# Altium integrated library OpenCore_Carrier_Board.IntLib: 44 symbols (continued)
## KRIA_K26_SOM (continued)
part B pins: S1_C1 GND (power) "Ground, connect to carrier card ground plane", S1_C2 GND (power) "Ground, connect to carrier card ground plane", S1_C3 HPA00_CC_P (io) "HPIO clock-capable pin on bank 66", S1_C4 HPA00_CC_N (io) "HPIO clock-capable pin on bank 66", S1_C5 GND (power) "Ground, connect to carrier card ground plane", S1_C6 HPA03_P (io) "HPIO on bank 66", S1_C7 HPA03_N (io) "HPIO on bank 66", S1_C8 GND (power) "Ground, connect to carrier card ground plane", S1_C9 HPA08_P (io) "HPIO on bank 66", S1_C10 HPA08_N (io) "HPIO on bank 66", S1_C11 GND (power) "Ground, connect to carrier card ground plane", S1_C12 HPA10_CC_P (io) "HPIO clock-capable pin on bank 66", S1_C13 HPA10_CC_N (io) "HPIO clock-capable pin on bank 66", S1_C14 GND (power) "Ground, connect to carrier card ground plane", S1_C15 PS_POR_L (in) "PS power-on reset driven by the carrier card. When deasserted, the PS begins the boot process.", S1_C16 PS_SRST_C2M_L (in) "PS system reset driven by the carrier card. When asserted, forces the PS to enter the system reset sequence.", S1_C17 GND (power) "Ground, connect to carrier card ground plane", S1_C18 HDA06 (io) "HDIO on bank 45", S1_C19 HDA07 (io) "HDIO on bank 45", S1_C20 HDA08_CC (io) "HDIO clock-capable pin on bank 45", S1_C21 GND (power) "Ground", S1_C22 HDA18 (io) "HDIO on bank 45", S1_C23 HDA19 (io) "HDIO on bank 45", S1_C24 HDA20 (io) "HDIO on bank 45", S1_C25 GND (power) "Ground, connect to carrier card ground plane", S1_C26 MIO24_I2C_SCK (out) "PS I2C clock output, bank 500", S1_C27 MIO25_I2C_SDA (io) "PS I2C serial data, bank 500", S1_C28 MIO12_FWUEN_C2M_L (io) "PS MIO signal on bank 500. Optional default use as firmware update enable indication in the released Kria PetaLinux BSPs.", S1_C29 GND (power) "Ground, connect to carrier card ground plane", S1_C30 MIO29 (io) "PS MIO signal on bank 501. Optional use as PMU input.", S1_C31 MIO30 (io) "PS MIO signal on bank 501. Optional use as PMU input.", S1_C32 MIO31_PMU_GPI (io) "PS MIO signal on bank 501. Optional use as PMU input. In default Kria PetaLinux BSPs, this is a PMU library enabled input for hardware-initiated shutdown by the PMU.", S1_C33 GND (power) "Ground, connect to carrier card ground plane", S1_C34 MIO47 (io) "PS MIO signal on bank 501", S1_C35 MIO48 (io) "PS MIO signal on bank 501", S1_C36 MIO49 (io) "PS MIO signal on bank 501", S1_C37 GND (power) "Ground, connect to carrier card ground plane", S1_C38 MIO55 (io) "PS MIO signal on bank 502", S1_C39 MIO56 (io) "PS MIO signal on bank 502", S1_C40 MIO57 (io) "PS MIO signal on bank 502", S1_C41 GND (power) "Ground, connect to carrier card ground plane", S1_C42 MIO67 (io) "PS MIO signal on bank 502", S1_C43 MIO68 (io) "PS MIO signal on bank 502", S1_C44 MIO69 (io) "PS MIO signal on bank 502", S1_C45 Reserved "No connect on the SOM", S1_C46 GND (power) "Ground, connect to carrier card ground plane", S1_C47 GTR_REFCLK0_C2M_P (in) "PS-GTR REFCLK0 input, bank 505", S1_C48 GTR_REFCLK0_C2M_N (in) "PS-GTR REFCLK0 input, bank 505", S1_C49 GND (power) "Ground, connect to carrier card ground plane", S1_C50 GND (power) "Ground, connect to carrier card ground plane", S1_C51 GTR_DP3_M2C_P (out) "PS-GTR lane 3 TX, bank 505", S1_C52 GTR_DP3_M2C_N (out) "PS-GTR lane 3 TX, bank 505", S1_C53 GND (power) "Ground, connect to carrier card ground plane", S1_C54 GND (power) "Ground, connect to carrier card ground plane", S1_C55 GTR_DP1_C2M_P (in) "PS-GTR lane 1 RX, bank 505", S1_C56 GTR_DP1_C2M_N (in) "PS-GTR lane 1 RX, bank 505", S1_C57 GND (power) "Ground, connect to carrier card ground plane", S1_C58 GND (power) "Ground, connect to carrier card ground plane", S1_C59 VCC_SOM (power) "SOM main supply voltage, +5V", S1_C60 VCC_SOM (power) "SOM main supply voltage, +5V", S1_D1 VCCO_HPA (power) "HPA I/O voltage rail, 1.0V to 1.8V", S1_D2 VCCO_HPA (power) "HPA I/O voltage rail, 1.0V to 1.8V", S1_D3 GND (power) "Ground, connect to carrier card ground plane", S1_D4 HPA02_P (io) "HPIO on bank 66", S1_D5 HPA02_N (io) "HPIO on bank 66", S1_D6 GND (power) "Ground, connect to carrier card ground plane", S1_D7 HPA01_P (io) "HPIO on bank 66", S1_D8 HPA01_N (io) "HPIO on bank 66", S1_D9 GND (power) "Ground, connect to carrier card ground plane", S1_D10 HPA09_P (io) "HPIO on bank 66", S1_D11 HPA09_N (io) "HPIO on bank 66", S1_D12 GND (power) "Ground, connect to carrier card ground plane", S1_D13 HPA14_P (io) "HPIO on bank 66", S1_D14 HPA14_N (io) "HPIO on bank 66", S1_D15 GND (power) "Ground, connect to carrier card ground plane", S1_D16 HDA00_CC (io) "HDIO clock-capable pin on bank 45", S1_D17 HDA01 (io) "HDIO on bank 45", S1_D18 HDA02 (io) "HDIO on bank 45", S1_D19 GND (power) "Ground, connect to carrier card ground plane", S1_D20 HDA12 (io) "HDIO on bank 45", S1_D21 HDA13 (io) "HDIO on bank 45", S1_D22 HDA14 (io) "HDIO on bank 45", S1_D23 GND (power) "Ground, connect to carrier card ground plane", S1_D24 PWRGD_FPD_M2C "Power good indication for PS FPD power rails", S1_D25 PWRGD_LPD_M2C "Power good indication for PS LPD power rails", S1_D26 PWRGD_PL_M2C "Power good indication for all PL power rails", S1_D27 GND (power) "Ground, connect to carrier card ground plane", S1_D28 MIO26 (io) "PS MIO signal on bank 501. Optional use as PMU input.", S1_D29 MIO27 (io) "PS MIO signal on bank 501. Optional use as PMU input.", S1_D30 MIO28 (io) "PS MIO signal on bank 501. Optional use as PMU input.", S1_D31 GND (power) "Ground, connect to carrier card ground plane", S1_D32 MIO44 (io) "PS MIO signal on bank 501", S1_D33 MIO45 (io) "PS MIO signal on bank 501", S1_D34 MIO46 (io) "PS MIO signal on bank 501", S1_D35 GND (power) "Ground, connect to carrier card ground plane", S1_D36 MIO52 (io) "PS MIO signal on bank 502", S1_D37 MIO53 (io) "PS MIO signal on bank 502", S1_D38 MIO54 (io) "PS MIO signal on bank 502", S1_D39 GND (power) "Ground, connect to carrier card ground plane", S1_D40 MIO64 (io) "PS MIO signal on bank 502", S1_D41 MIO65 (io) "PS MIO signal on bank 502", S1_D42 MIO66 (io) "PS MIO signal on bank 502", S1_D43 GND (power) "Ground, connect to carrier card ground plane", S1_D44 MIO76 (io) "PS MIO signal on bank 502", S1_D45 MIO77 (io) "PS MIO signal on bank 502", S1_D46 Reserved "No connect on the SOM", S1_D47 GND (power) "Ground, connect to carrier card ground plane", S1_D48 GND (power) "Ground, connect to carrier card ground plane", S1_D49 GTR_DP3_C2M_P (in) "PS-GTR lane 3 RX, bank 505", S1_D50 GTR_DP3_C2M_N (in) "PS-GTR lane 3 RX, bank 505", S1_D51 GND (power) "Ground, connect to carrier card ground plane", S1_D52 GND (power) "Ground, connect to carrier card ground plane", S1_D53 GTR_REFCLK2_C2M_P (in) "PS-GTR REFCLK2 input, bank 505", S1_D54 GTR_REFCLK2_C2M_N (in) "PS-GTR REFCLK2 input, bank 505", S1_D55 GND (power) "Ground, connect to carrier card ground plane", S1_D56 GND (power) "Ground, connect to carrier card ground plane", S1_D57 GTR_DP2_M2C_P (out) "PS-GTR lane 2 TX, bank 505", S1_D58 GTR_DP2_M2C_N (out) "PS-GTR lane 2 TX, bank 505", S1_D59 GND (power) "Ground, connect to carrier card ground plane", S1_D60 VCC_SOM (power) "SOM main supply voltage, +5V", S1_SH1 SH1, S1_SH2 SH2
part C pins: S2_A1 GND (power) "Ground, connect to carrier card ground plane", S2_A2 GND (power) "Ground, connect to carrier card ground plane", S2_A3 GTH_DP3_M2C_P (out) "GTH lane 3 TX, bank 224", S2_A4 GTH_DP3_M2C_N (out) "GTH lane 3 TX, bank 224", S2_A5 GND (power) "Ground, connect to carrier card ground plane", S2_A6 GND (power) "Ground, connect to carrier card ground plane", S2_A7 GTH_REFCLK1_C2M_P (in) "GTH REFCLK1 input, bank 224", S2_A8 GTH_REFCLK1_C2M_N (in) "GTH REFCLK1 input, bank 224", S2_A9 GND (power) "Ground, connect to carrier card ground plane", S2_A10 GND (power) "Ground, connect to carrier card ground plane", S2_A11 HPB15_CC_P (io) "HPIO clock-capable pin on bank 65", S2_A12 HPB15_CC_N (io) "HPIO clock-capable pin on bank 65", S2_A13 GND (power) "Ground, connect to carrier card ground plane", S2_A14 HPB08_P (io) "HPIO on bank 65", S2_A15 HPB08_N (io) "HPIO on bank 65", S2_A16 GND (power) "Ground, connect to carrier card ground plane", S2_A17 HPB12_P (io) "HPIO on bank 65", S2_A18 HPB12_N (io) "HPIO on bank 65", S2_A19 GND (power) "Ground, connect to carrier card ground plane", S2_A20 HPB06_P (io) "HPIO on bank 65", S2_A21 HPB06_N (io) "HPIO on bank 65", S2_A22 GND (power) "Ground, connect to carrier card ground plane", S2_A23 HPB16_P (io) "HPIO on bank 65", S2_A24 HPB16_N (io) "HPIO on bank 65", S2_A25 GND (power) "Ground, connect to carrier card ground plane", S2_A26 HPB19_P (io) "HPIO on bank 65", S2_A27 HPB19_N (io) "HPIO on bank 65", S2_A28 GND (power) "Ground, connect to carrier card ground plane", S2_A29 HPC08_P (io) "HPIO on bank 64", S2_A30 HPC08_N (io) "HPIO on bank 64", S2_A31 GND (power) "Ground, connect to carrier card ground plane", S2_A32 HPC19_P (io) "HPIO on bank 64", S2_A33 HPC19_N (io) "HPIO on bank 64", S2_A34 GND (power) "Ground, connect to carrier card ground plane", S2_A35 HPC14_P (io) "HPIO on bank 64", S2_A36 HPC14_N (io) "HPIO on bank 64", S2_A37 GND (power) "Ground, connect to carrier card ground plane", S2_A38 HPC15_CC_P (io) "HPIO clock-capable pin on bank 64", S2_A39 HPC15_CC_N (io) "HPIO clock-capable pin on bank 64", S2_A40 GND (power) "Ground, connect to carrier card ground plane", S2_A41 HPC03_P (io) "HPIO on bank 64", S2_A42 HPC03_N (io) "HPIO on bank 64", S2_A43 GND (power) "Ground, connect to carrier card ground plane", S2_A44 VCCO_HPB (power) "HPB I/O voltage rail, 1.0V to 1.8V", S2_A45 GND (power) "Ground, connect to carrier card ground plane", S2_A46 HDB18 (io) "HDIO on bank 43", S2_A47 HDB19 (io) "HDIO on bank 43", S2_A48 HDB20 (io) "HDIO on bank 43", S2_A49 GND (power) "Ground, connect to carrier card ground plane", S2_A50 HDB21 (io) "HDIO on bank 43", S2_A51 HDB22 (io) "HDIO on bank 43", S2_A52 HDB23 (io) "HDIO on bank 43", S2_A53 GND (power) "Ground, connect to carrier card ground plane", S2_A54 HDC18 (io) "HDIO on bank 44", S2_A55 HDC19 (io) "HDIO on bank 44", S2_A56 HDC20 (io) "HDIO on bank 44", S2_A57 GND (power) "Ground, connect to carrier card ground plane", S2_A58 HDC21 (io) "HDIO on bank 44", S2_A59 HDC22 (io) "HDIO on bank 44", S2_A60 HDC23 (io) "HDIO on bank 44", S2_B1 GTH_DP2_C2M_P (in) "GTH lane 2 RX, bank 224", S2_B2 GTH_DP2_C2M_N (in) "GTH lane 2 RX, bank 224", S2_B3 GND (power) "Ground, connect to carrier card ground plane", S2_B4 GND (power) "Ground, connect to carrier card ground plane", S2_B5 GTH_DP2_M2C_P (out) "GTH lane 2 TX, bank 224", S2_B6 GTH_DP2_M2C_N (out) "GTH lane 2 TX, bank 224", S2_B7 GND (power) "Ground, connect to carrier card ground plane", S2_B8 GND (power) "Ground, connect to carrier card ground plane", S2_B9 GTH_DP0_C2M_P (in) "GTH lane 0 RX, bank 224", S2_B10 GTH_DP0_C2M_N (in) "GTH lane 0 RX, bank 224", S2_B11 GND (power) "Ground, connect to carrier card ground plane", S2_B12 HPB10_CC_P (io) "HPIO clock-capable pin on bank 65", S2_B13 HPB10_CC_N (io) "HPIO clock-capable pin on bank 65", S2_B14 GND (power) "Ground, connect to carrier card ground plane", S2_B15 HPB07_P (io) "HPIO on bank 65", S2_B16 HPB07_N (io) "HPIO on bank 65", S2_B17 GND (power) "Ground, connect to carrier card ground plane", S2_B18 HPB05_CC_P (io) "HPIO clock-capable pin on bank 65", S2_B19 HPB05_CC_N (io) "HPIO clock-capable pin on bank 65", S2_B20 GND (power) "Ground, connect to carrier card ground plane", S2_B21 HPB11_P (io) "HPIO on bank 65", S2_B22 HPB11_N (io) "HPIO on bank 65", S2_B23 GND (power) "Ground, connect to carrier card ground plane", S2_B24 HPB03_P (io) "HPIO on bank 65", S2_B25 HPB03_N (io) "HPIO on bank 65", S2_B26 GND (power) "Ground, connect to carrier card ground plane", S2_B27 HPC06_P (io) "HPIO on bank 64", S2_B28 HPC06_N (io) "HPIO on bank 64", S2_B29 GND (power) "Ground, connect to carrier card ground plane", S2_B30 HPC13_P (io) "HPIO on bank 64", S2_B31 HPC13_N (io) "HPIO on bank 64", S2_B32 GND (power) "Ground, connect to carrier card ground plane", S2_B33 HPC16_P (io) "HPIO on bank 64", S2_B34 HPC16_N (io) "HPIO on bank 64", S2_B35 GND (power) "Ground, connect to carrier card ground plane", S2_B36 HPC07_P (io) "HPIO on bank 64", S2_B37 HPC07_N (io) "HPIO on bank 64", S2_B38 GND (power) "Ground, connect to carrier card ground plane", S2_B39 HPC18_P (io) "HPIO on bank 64", S2_B40 HPC18_N (io) "HPIO on bank 64", S2_B41 GND (power) "Ground, connect to carrier card ground plane", S2_B42 VCCO_HPB (power) "HPB I/O voltage rail, 1.0V to 1.8V", S2_B43 GND (power) "Ground, connect to carrier card ground plane", S2_B44 HDB12 (io) "HDIO on bank 43", S2_B45 HDB13 (io) "HDIO on bank 43", S2_B46 HDB14 (io) "HDIO on bank 43", S2_B47 GND (power) "Ground, connect to carrier card ground plane", S2_B48 HDB15 (io) "HDIO on bank 43", S2_B49 HDB16_CC (io) "HDIO clock-capable pin on bank 43", S2_B50 HDB17 (io) "HDIO on bank 43", S2_B51 GND (power) "Ground, connect to carrier card ground plane", S2_B52 HDC12 (io) "HDIO on bank 44", S2_B53 HDC13 (io) "HDIO on bank 44", S2_B54 HDC14 (io) "HDIO on bank 44", S2_B55 GND (power) "Ground, connect to carrier card ground plane", S2_B56 HDC15 (io) "HDIO on bank 44", S2_B57 HDC16_CC (io) "HDIO clock-capable pin on bank 44", S2_B58 HDC17 (io) "HDIO on bank 44", S2_B59 VCCO_HDB (power) "HDB I/O voltage rail, 1.2V to 3.3V", S2_B60 VCCO_HDB (power) "HDB I/O voltage rail, 1.2V to 3.3V"
part D pins: S2_C1 GND (power) "Ground, connect to carrier card ground plane", S2_C2 GND (power) "Ground, connect to carrier card ground plane", S2_C3 GTH_REFCLK0_C2M_P (in) "GTH REFCLK0 input, bank 224", S2_C4 GTH_REFCLK0_C2M_N (in) "GTH REFCLK0 input, bank 224", S2_C5 GND (power) "Ground, connect to carrier card ground plane", S2_C6 GND (power) "Ground, connect to carrier card ground plane", S2_C7 GTH_DP1_M2C_P (out) "GTH lane 1 TX, bank 224", S2_C8 GTH_DP1_M2C_N (out) "GTH lane 1 TX, bank 224", S2_C9 GND (power) "Ground, connect to carrier card ground plane", S2_C10 GND (power) "Ground, connect to carrier card ground plane", S2_C11 HPB09_P (io) "HPIO on bank 65", S2_C12 HPB09_N (io) "HPIO on bank 65", S2_C13 GND (power) "Ground, connect to carrier card ground plane", S2_C14 HPB14_P (io) "HPIO on bank 65", S2_C15 HPB14_N (io) "HPIO on bank 65", S2_C16 GND (power) "Ground, connect to carrier card ground plane", S2_C17 HPB02_P (io) "HPIO on bank 65", S2_C18 HPB02_N (io) "HPIO on bank 65", S2_C19 GND (power) "Ground, connect to carrier card ground plane", S2_C20 HPB13_P (io) "HPIO on bank 65", S2_C21 HPB13_N (io) "HPIO on bank 65", S2_C22 GND (power) "Ground, connect to carrier card ground plane", S2_C23 HPB18_P (io) "HPIO on bank 65", S2_C24 HPB18_N (io) "HPIO on bank 65", S2_C25 GND (power) "Ground, connect to carrier card ground plane", S2_C26 HPC17_P (io) "HPIO on bank 64", S2_C27 HPC17_N (io) "HPIO on bank 64", S2_C28 GND (power) "Ground, connect to carrier card ground plane", S2_C29 HPC10_CC_P (io) "HPIO clock-capable pin on bank 64", S2_C30 HPC10_CC_N (io) "HPIO clock-capable pin on bank 64", S2_C31 GND (power) "Ground, connect to carrier card ground plane", S2_C32 HPC11_P (io) "HPIO on bank 64", S2_C33 HPC11_N (io) "HPIO on bank 64", S2_C34 GND (power) "Ground, connect to carrier card ground plane", S2_C35 HPC12_P (io) "HPIO on bank 64", S2_C36 HPC12_N (io) "HPIO on bank 64", S2_C37 GND (power) "Ground, connect to carrier card ground plane", S2_C38 HPC05_CC_P (io) "HPIO clock-capable pin on bank 64", S2_C39 HPC05_CC_N (io) "HPIO clock-capable pin on bank 64", S2_C40 GND (power) "Ground, connect to carrier card ground plane", S2_C41 HPC_CLK0_P (io) "HPIO global clock pin on bank 64", S2_C42 HPC_CLK0_N (io) "HPIO global clock pin on bank 64", S2_C43 GND (power) "Ground, connect to carrier card ground plane", S2_C44 VCCO_HPC (power) "HPC I/O voltage rail, 1.0V to 1.8V", S2_C45 GND (power) "Ground, connect to carrier card ground plane", S2_C46 HDB06 (io) "HDIO on bank 43", S2_C47 HDB07 (io) "HDIO on bank 43", S2_C48 HDB08_CC (io) "HDIO clock-capable pin on bank 43", S2_C49 GND (power) "Ground, connect to carrier card ground plane", S2_C50 HDB09 (io) "HDIO on bank 43", S2_C51 HDB10 (io) "HDIO on bank 43", S2_C52 HDB11 (io) "HDIO on bank 43", S2_C53 GND (power) "Ground, connect to carrier card ground plane", S2_C54 HDC06 (io) "HDIO on bank 44", S2_C55 HDC07 (io) "HDIO on bank 44", S2_C56 HDC08_CC (io) "HDIO clock-capable pin on bank 44", S2_C57 GND (power) "Ground, connect to carrier card ground plane", S2_C58 HDC09 (io) "HDIO on bank 44", S2_C59 HDC10 (io) "HDIO on bank 44", S2_C60 HDC11 (io) "HDIO on bank 44", S2_D1 GTH_DP1_C2M_P (in) "GTH lane 1 RX, bank 224", S2_D2 GTH_DP1_C2M_N (in) "GTH lane 1 RX, bank 224", S2_D3 GND (power) "Ground, connect to carrier card ground plane", S2_D4 GND (power) "Ground, connect to carrier card ground plane", S2_D5 GTH_DP3_C2M_P (in) "GTH lane 3 RX, bank 224", S2_D6 GTH_DP3_C2M_N (in) "GTH lane 3 RX, bank 224", S2_D7 GND (power) "Ground, connect to carrier card ground plane", S2_D8 GND (power) "Ground, connect to carrier card ground plane", S2_D9 GTH_DP0_M2C_P (out) "GTH lane 0 TX, bank 224", S2_D10 GTH_DP0_M2C_N (out) "GTH lane 0 TX, bank 224", S2_D11 GND (power) "Ground, connect to carrier card ground plane", S2_D12 HPB01_P (io) "HPIO on bank 65", S2_D13 HPB01_N (io) "HPIO on bank 65", S2_D14 GND (power) "Ground, connect to carrier card ground plane", S2_D15 HPB00_CC_P (io) "HPIO clock-capable pin on bank 65", S2_D16 HPB00_CC_N (io) "HPIO clock-capable pin on bank 65", S2_D17 GND (power) "Ground, connect to carrier card ground plane", S2_D18 HPB_CLK0_P (io) "HPIO global clock pin on bank 65", S2_D19 HPB_CLK0_N (io) "HPIO global clock pin on bank 65", S2_D20 GND (power) "Ground, connect to carrier card ground plane", S2_D21 HPB04_P (io) "HPIO on bank 65", S2_D22 HPB04_N (io) "HPIO on bank 65", S2_D23 GND (power) "Ground, connect to carrier card ground plane", S2_D24 HPB17_P (io) "HPIO on bank 65", S2_D25 HPB17_N (io) "HPIO on bank 65", S2_D26 GND (power) "Ground, connect to carrier card ground plane", S2_D27 HPC09_P (io) "HPIO on bank 64", S2_D28 HPC09_N (io) "HPIO on bank 64", S2_D29 GND (power) "Ground, connect to carrier card ground plane", S2_D30 HPC01_P (io) "HPIO on bank 64", S2_D31 HPC01_N (io) "HPIO on bank 64", S2_D32 GND (power) "Ground, connect to carrier card ground plane", S2_D33 HPC00_CC_P (io) "HPIO clock-capable pin on bank 64", S2_D34 HPC00_CC_N (io) "HPIO clock-capable pin on bank 64", S2_D35 GND (power) "Ground, connect to carrier card ground plane", S2_D36 HPC02_P (io) "HPIO on bank 64", S2_D37 HPC02_N (io) "HPIO on bank 64", S2_D38 GND (power) "Ground, connect to carrier card ground plane", S2_D39 HPC04_P (io) "HPIO on bank 64", S2_D40 HPC04_N (io) "HPIO on bank 64", S2_D41 GND (power) "Ground, connect to carrier card ground plane", S2_D42 VCCO_HPC (power) "HPC I/O voltage rail, 1.0V to 1.8V", S2_D43 GND (power) "Ground, connect to carrier card ground plane", S2_D44 HDB00_CC (io) "HDIO clock-capable pin on bank 43", S2_D45 HDB01 (io) "HDIO on bank 43", S2_D46 HDB02 (io) "HDIO on bank 43", S2_D47 GND (power) "Ground, connect to carrier card ground plane", S2_D48 HDB03 (io) "HDIO on bank 43", S2_D49 HDB04 (io) "HDIO on bank 43", S2_D50 HDB05 (io) "HDIO on bank 43", S2_D51 GND (power) "Ground, connect to carrier card ground plane", S2_D52 HDC00_CC (io) "HDIO clock-capable pin on bank 44", S2_D53 HDC01 (io) "HDIO on bank 44", S2_D54 HDC02 (io) "HDIO on bank 44", S2_D56 HDC03 (io) "HDIO on bank 44", S2_D57 HDC04 (io) "HDIO on bank 44", S2_D58 HDC05 (io) "HDIO on bank 44", S2_D59 VCCO_HDC (power) "HDC I/O voltage rail, 1.2V to 3.3V", S2_D60 VCCO_HDC (power) "HDC I/O voltage rail, 1.2V to 3.3V", S2_SH1 SH1, S2_SH2 SH2
part A text: SOM1; A & B
part B text: SOM1; C & D
part C text: SOM2; A & B
part D text: SOM2; C & D

## PCIe_EDGE
designator J?
PCIe 3.3V x16
footprint PCIe
pins: A1 PRSNT#1 (in) "The presence detects indication. Should be grounded on the carrier board.", A2 12V (power) "Power", A3 12V (power) "Power", A4 GND (power) "Ground", A5 JTAG_HOST_TCK (in) "TCK", A6 JTAG_HOST_TDI (in) "TDI", A7 JTAG_HOST_TDO (out) "TDO", A8 JTAG_HOST_TMS (in) "TMS", A9 3V3 (power) "Power", A10 3V3 (power) "Power", A11 PERST# (out) "PCIe Interface Reset#", A12 GND (power) "Ground", A13 REFCLK+ (out) "PCIe Reference Differential Clock", A14 REFCLK- (out) "PCIe Reference Differential Clock", A15 GND (power) "Ground", A16 HSIp(0) (out) "RX Lane 0", A17 HSIn(0) (out) "RX Lane 0", A18 GND (power) "Ground", A19 RSVD "NC", A20 GND (power) "Ground", A21 HSIp(1) (out) "RX Lane 1", A22 HSIn(1) (out) "RX Lane 1", A23 GND (power) "Ground", A24 GND (power) "Ground", A25 HSIp(2) (out) "RX Lane 2", A26 HSIn(2) (out) "RX Lane 2", A27 GND (power) "Ground", A28 GND (power) "Ground", A29 HSIp(3) (out) "RX Lane 3", A30 HSIn(3) (out) "RX Lane 3", A31 GND (power) "Ground", A32 RSVD (in) "UART0_RXD", A33 RSVD (out) "UART0_TXD", A34 GND (power) "Ground", A35 HSIp(4) (out) "RX Lane 4", A36 HSIn(4) (out) "RX Lane 4", A37 GND (power) "Ground", A38 GND (power) "Ground", A39 HSIp(5) (out) "RX Lane 5", A40 HSIn(5) (out) "RX Lane 5", A41 GND (power) "Ground", A42 GND (power) "Ground", A43 HSIp(6) (out) "RX Lane 6", A44 HSIn(6) (out) "RX Lane 6", A45 GND (power) "Ground", A46 GND (power) "Ground", A47 HSIp(7) (out) "RX Lane 7", A48 HSIn(7) (out) "RX Lane 7", A49 GND (power) "Ground", A50 RSVD "Not connected", A51 GND (power) "Ground", A52 HSIp(8) (out) "RX Lane 8", A53 HSIn(8) (out) "RX Lane 8", A54 GND (power) "Ground", A55 GND (power) "Ground", A56 HSIp(9) (out) "RX Lane 9", A57 HSIn(9) (out) "RX Lane 9", A58 GND (power) "Ground", A59 GND (power) "Ground", A60 HSIp(10) (out) "RX Lane 10", A61 HSIn(10) (out) "RX Lane 10", A62 GND (power) "Ground", A63 GND (power) "Ground", A64 HSIp(11) (out) "RX Lane 11", A65 HSIn(11) (out) "RX Lane 11", A66 GND (power) "Ground", A67 GND (power) "Ground", A68 HSIp(12) (out) "RX Lane 12", A69 HSIn(12) (out) "RX Lane 12", A70 GND (power) "Ground", A71 GND (power) "Ground", A72 HSIp(13) (out) "RX Lane 13", A73 HSIn(13) (out) "RX Lane 13", A74 GND (power) "Ground", A75 GND (power) "Ground", A76 HSIp(14) (out) "RX Lane 14", A77 HSIn(14) (out) "RX Lane 14", A78 GND (power) "Ground", A79 GND (power) "Ground", A80 HSIp(15) (out) "RX Lane 15", A81 HSIn(15) (out) "RX Lane 15", A82 GND (power) "Ground", B1 12V (power) "Power", B2 12V (power) "Power", B3 12V (power) "Power", B4 GND (power) "Ground", B5 SMCLK (in) "SMBUS_SCL", B6 SMDAT (io) "SMBUS_SDA", B7 GND (power) "Ground", B8 3V3 (power) "Power", B9 JTAG1 (in) "TRST#", B10 3V3_AUX (power), B11 WAKE# "Link Reactivation", B12 RSVD "Reserved", B13 GND (power) "Ground", B14 HSOp(0) (in) "TX Lane 0", B15 HSOn(0) (in) "TX Lane 0", B16 GND (power) "Ground", B17 PRSNT#2 "Hotplug detect", B18 GND (power) "Ground", B19 HSOp(1) (in) "TX Lane 1", B20 HSOn(1) (in) "TX Lane 1", B21 GND (power) "Ground", B22 GND (power) "Ground", B23 HSOp(2) (in) "TX Lane 2", B24 HSOn(2) (in) "TX Lane 2", B25 GND (power) "Ground", B26 GND (power) "Ground", B27 HSOp(3) (in) "TX Lane 3", B28 HSOn(3) (in) "TX Lane 3", B29 GND (power) "Ground", B30 RSVD "Reserved", B31 PRSNT#2 "Hotplug detect", B32 GND (power) "Ground", B33 HSOp(4) (in) "TX Lane 4", B34 HSOn(4) (in) "TX Lane 4", B35 GND (power) "Ground", B36 GND (power) "Ground", B37 HSOp(5) (in) "TX Lane 5", B38 HSOn(5) (in) "TX Lane 5", B39 GND (power) "Ground", B40 GND (power) "Ground", B41 HSOp(6) (in) "TX Lane 6", B42 HSOn(6) (in) "TX Lane 6", B43 GND (power) "Ground", B44 GND (power) "Ground", B45 HSOp(7) (in) "TX Lane 7", B46 HSOn(7) (in) "TX Lane 7", B47 GND (power) "Ground", B48 PRSNT#2 "Hotplug detect", B49 GND (power) "Ground", B50 HSOp(8) (in) "TX Lane 8", B51 HSOn(8) (in) "TX Lane 8", B52 GND (power) "Ground", B53 GND (power) "Ground", B54 HSOp(9) (in) "TX Lane 9", B55 HSOn(9) (in) "TX Lane 9", B56 GND (power) "Ground", B57 GND (power) "Ground", B58 HSOp(10) (in) "TX Lane 10", B59 HSOn(10) (in) "TX Lane 10", B60 GND (power) "Ground", B61 GND (power) "Ground", B62 HSOp(11) (in) "TX Lane 11", B63 HSOn(11) (in) "TX Lane 11", B64 GND (power) "Ground", B65 GND (power) "Ground", B66 HSOp(12) (in) "TX Lane 12", B67 HSOn(12) (in) "TX Lane 12", B68 GND (power) "Ground", B69 GND (power) "Ground", B70 HSOp(13) (in) "TX Lane 13", B71 HSOn(13) (in) "TX Lane 13", B72 GND (power) "Ground", B73 GND (power) "Ground", B74 HSOp(14) (in) "TX Lane 14", B75 HSOn(14) (in) "TX Lane 14", B76 GND (power) "Ground", B77 GND (power) "Ground", B78 HSOp(15) (in) "TX Lane 15", B79 HSOn(15) (in) "TX Lane 15", B80 GND (power) "Ground", B81 PRSNT#2 (out) "Hotplug present detect", B82 RSVD#2 "Hotplug detect"

## PTS_647_SN50_SMTR2_LFS
designator SW?
SWITCH TACTILE SPST-NO 0.05A 12V
footprint TACTILE_SW_4.5MM (CKS Tactile Switch - 4.5mm x 4.5mm)
pins: 1, 2, 3, 4

## SMAJ15CA
designator D??, comment Manufacturer Part Number: SMAJ15CA  (hidden comment: TVS DIODE 15VWM 24.4VC DO214AC)
24.4V Clamp 16.4A Ipp Tvs Diode Surface Mount DO-214AC (SMA)
pins: A Anode, K Cathode

## SN65LVDS180PWR
designator U?
IC TRANSCEIVER FULL 1/1 14TSSOP; Manufacturer_Name: Texas Instruments; Datasheet Link: https://www.ti.com/lit/ds/symlink/sn65lvds050.pdf; Height: 1.2 mm; Manufacturer_Part_Number: SN65LVDS180PWR
footprint TI_TSSOP14_PW (TSOP, 14-Leads, Body 5.00x4.40mm, Pitch 0.65mm, IPC Medium Density)
pins: 1 NC, 2 ROUT (out) "LVTTL output signal", 3 ~{RE} (in) "Receiver enable", 4 DE (in) "Driver enable", 5 DIN (in) "LVTTL input signal", 6 GND (power) "Ground", 7 GND (power) "Ground", 8 NC, 9 Y/DO+ (out) "Differential (LVDS) non-inverting output", 10 Z/DO- (out) "Differential (LVDS) inverting output", 11 B/RI- (in) "Differential (LVDS) inverting input", 12 A/RI+ (in) "Differential (LVDS) non-inverting input", 13 VCC (power) "Supply Voltage", 14 VCC (power) "Supply Voltage"

## SW_SLIDE_TOGGLE
designator S?  (value not drawn)
SWITCH SLIDE SPDT 5A 28V; Manufacturer 1: E-Switch; Manufacturer Part Number 1: 500SSP1S2M2QEA; Package/Footprint: TH; Supplier 1: Digi-Key; Mounting Type: TH; Voltage Rating (DC): 28V; Throw Configuration: SPDT; Supplier Part Number 1: EG5137-ND
footprint 500SSP1S2M2QEA
pins: 1, 2, 3

## TP_1MM
designator TP?, comment 1mm Round Pad Testpoint  (value not drawn)
footprint TP_1MM (1MM SMD Round Pad)
pins: 1

## TP_2MM
designator TP?, comment 2mm Round Pad Testpoint  (value not drawn)
footprint TP_2MM (2MM SMD Round Pad)
pins: 1

## TPS62A01ADRL
designator U?
IC REG BUCK ADJ 1A SOT5X3; Manufacturer: Texas Instruments; Manufacturer Part Number: TLV62568ADRLR
footprint TI_SOT6_DRL0006A (SOTFL, 6-Leads, Body 1.60x1.60mm, Pitch 0.50mm, IPC Medium Density)
pins: 1 GND (power), 2 SW (out), 3 VIN (power), 4 EN (in), 5 FB (in), 6 PG (out)

## TPS51386RJNR
designator U?
IC REG BUCK ADJ 8A 12-PowerVFQFN; Manufacturer: Texas Instruments; Manufacturer Part Number: TPS51386RJNR
footprint TI_RJN0012A_POWERVQFN12 (12 VQFN-HR)
pins: 1 VIN (power), 2 PGND (power), 3 PG (out), 4 FB (in), 5 SS (out), 6 NC, 7 SW (out), 8 VBST (in), 9 VCC (out), 10 AGND (power), 11 EN (in), 12 MODE (in)

## TPS563257DRLR
designator U?
IC REG BUCK ADJ 3A SOT563
footprint TI_SOT6_DRL0006A (SOTFL, 6-Leads, Body 1.60x1.60mm, Pitch 0.50mm, IPC Medium Density)
pins: 1 VIN (power), 2 SW (out), 3 GND (power), 4 PG (out), 5 EN (in), 6 FB (in)